# Altium footprint library NDLib.PCBLIB: 499 footprints (part 8 of 32)
Each footprint in its own frame and in the unit in brackets; x right, y up, seen from the top. Pads: shape width x height; smd on the part's side, far side on the other; paste and mask are expansions set on the pad; w line width, h text height; cw(c..) or ccw(c..) is an arc to the next point about the centre after c.
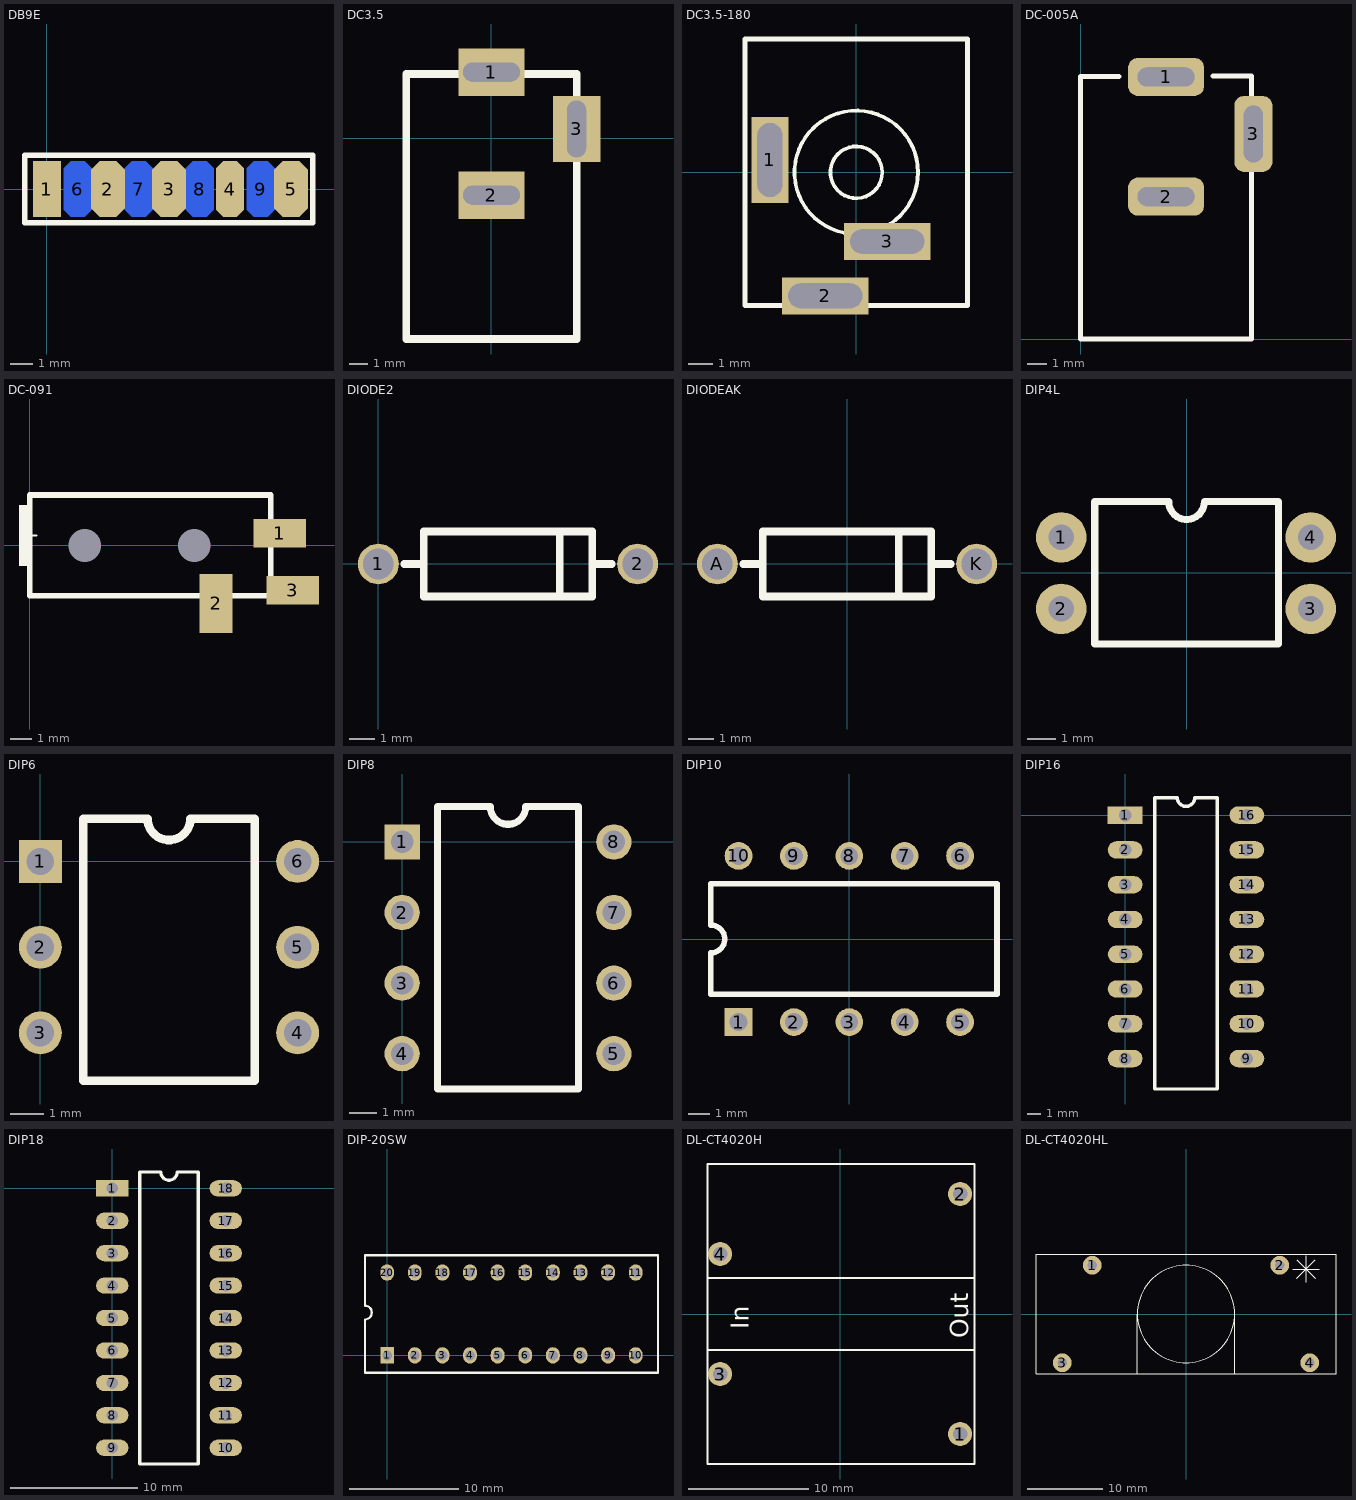
[diagram p7: the footprints below, top view; thin cyan lines are the x and y axes]

## DB9E [mil]
pads (9):
  rect 50x100 smd: 1(0,0)
  oct 60x100 smd: 2(109,0) 3(218,0) 5(436,0)
  oct 50x100 smd: 4(327,0)
  oct 50x100 smd far side: 6(55,0) 7(164,0) 8(273,0) 9(382,0)
TopOverlay:
  lines w10: -40,-60 475,-60 475,60 -40,60 -40,-60

## DC3.5 [mm]
height 15
pads (3):
  rect 3.5x2.5 hole 1 slot 3 at 0 deg: 1(0,3.5) 2(0,-3)
  rect 2.5x3.5 hole 1 slot 3 at 90 deg: 3(4.5,0.5)
TopOverlay:
  lines w0.4: -4.5,-10.6 -4.5,3.4 4.5,3.4 4.5,-10.6 -4.5,-10.6

## DC3.5-180 [mm]
height 15
pads (3):
  rect 1.5x3.5 hole 1 slot 3 at 90 deg: 1(-3.5,0.5)
  rect 3.5x1.5 hole 1 slot 3 at 0 deg: 2(-1.25,-5) 3(1.25,-2.8)
TopOverlay:
  circle w0.152: c0,0 r1.05
  circle w0.152: c0,0 r2.5
  lines w0.2: -4.5,-5.4 -4.5,5.4 4.5,5.4 4.5,-5.4 -4.5,-5.4

## DC-005A [mm]
height 7
pads (3):
  rrect50% 4x2 hole 1 slot 3 at 0 deg: 1(4.5,13.8) 2(4.5,7.5)
  rrect50% 2x4 hole 1 slot 3 at 90 deg: 3(9.1,10.8)
TopOverlay:
  lines w0.254: 2.018,13.818 0,13.818 0,0 9,0 9,8.8 ; 6.957,13.843 9,13.843 9,12.8
3D body: height 11.02, standoff -3.48, extent -0.003,0.017 9.503,13.843

## DC-091 [mm]
pads (5):
  round 0 hole 1.5 mask+0: 0(2.5,0) 0(7.5,0)
  rect 2.4x1.3 smd: 1(11.4,0.55) 3(12,-2.05)
  rect 1.5x2.7 smd: 2(8.5,-2.65)
TopOverlay:
  rectangle: -0.5,-0.95 0.1,1.85
  lines w0.1: -0.2,0.45 0.3,0.45
  lines w0.254: 0,-2.3 0,2.3 11,2.3 11,-2.3 0,-2.3
3D body: height 4.4, standoff -0.8, extent 0.025,-3.875 12.625,2.425

## DIODE2 [mm]
pads (2):
  round 1.6 / inner round 1.6 / far side round 2 hole 1.2: 1(0,0) 2(10.16,0)
TopOverlay:
  lines w0.305: 1.016,0 1.778,0 ; 7.112,-1.27 7.112,1.27 ; 8.382,0 9.144,0 ; 1.778,-1.27 1.778,1.27 8.382,1.27 8.382,-1.27 1.778,-1.27
3D body: height 3.3, standoff -2, extent -0.53,-1.3 10.53,1.3

## DIODEAK [mm]
height 2.5
pads (2):
  round 1.6 / inner round 1.6 / far side round 2 hole 1.2: A(-5.08,0) K(5.08,0)
TopOverlay:
  lines w0.305: -4.064,0 -3.302,0 ; 2.032,-1.27 2.032,1.27 ; 3.302,0 4.064,0 ; -3.302,-1.27 3.302,-1.27 3.302,1.27 -3.302,1.27 -3.302,-1.27
3D body: height 3.3, standoff -2, extent -5.53,-1.3 5.53,1.3

## DIP4L [mm]
height 5
pads (4):
  round 1.8 hole 0.914: 1(-4.469,1.266) 2(-4.469,-1.284) 3(4.431,-1.284) 4(4.431,1.266)
TopOverlay:
  lines w0.254: -3.275,-2.54 -3.275,2.54 -0.635,2.54 ccw(c0,2.54) 0.635,2.54 3.275,2.54 3.275,-2.54 -3.275,-2.54

## DIP6 [mil]
pads (6):
  rect 50x50 hole 32: 1(0,0)
  round 50 hole 32: 2(0,-100) 3(0,-200) 4(300,-200) 5(300,-100) 6(300,0)
TopOverlay:
  lines w10: 50,-255.91 250,-255.91 250,50 175,50 cw(c150,50) 125,50 50,50 50,-255.91
3D body: height 200, standoff -137.8, extent -50154.92,-50214.96 -49845.08,-49785.04

## DIP8 [mil]
pads (8):
  rect 50x50 hole 32: 1(0,0)
  round 50 hole 32: 2(0,-100) 3(0,-200) 4(0,-300) 5(300,-300) 6(300,-200) 7(300,-100) 8(300,0)
TopOverlay:
  lines w10: 50,-350 50,50 125,50 ccw(c150,50) 175,50 250,50 250,-350 50,-350
3D body: height 188.19, standoff -109.84, extent -4.84,-363.92 305,66

## DIP10 [mil]
pads (10):
  rect 50x50 hole 32: 1(-200,-150)
  round 50 hole 32: 2(-100,-150) 3(0,-150) 4(100,-150) 5(200,-150) 6(200,150) 7(100,150) 8(0,150) 9(-100,150) 10(-200,150)
TopOverlay:
  lines w10: -250,-100 266.73,-100 266.73,100 -250,100 -250,25 cw(c-250,0) -250,-25 -250,-100

## DIP16 [mil]
pads (16):
  rect 100x50 hole 36: 1(0,0)
  oval 100x50 hole 36: 2(0,-100) 3(0,-200) 4(0,-300) 5(0,-400) 6(0,-500) 7(0,-600) 8(0,-700) 9(350,-700) 10(350,-600) 11(350,-500) 12(350,-400) 13(350,-300) 14(350,-200) 15(350,-100) 16(350,0)
TopOverlay:
  lines w10: 85,-787.4 265,-787.4 265,50 200,50 cw(c175,50) 150,50 85,50 85,-787.4

## DIP18 [mil]
pads (18):
  rect 100x50 hole 36: 1(0,0)
  oval 100x50 hole 36: 2(0,-100) 3(0,-200) 4(0,-300) 5(0,-400) 6(0,-500) 7(0,-600) 8(0,-700) 9(0,-800) 10(350,-800) 11(350,-700) 12(350,-600) 13(350,-500) 14(350,-400) 15(350,-300) 16(350,-200) 17(350,-100) 18(350,0)
TopOverlay:
  lines w10: 85,-850 85,50 150,50 ccw(c175,50) 200,50 265,50 265,-850 85,-850

## DIP-20SW [mm] "DIP; 16 Leads; Row Spacing 7.62 mm; Pitch 2.54 mm"
pads (20):
  rect 1.27x1.5 hole 0.9: 1(0,0)
  oval 1.27x1.5 hole 0.9: 2(2.54,0) 3(5.08,0) 4(7.62,0) 5(10.16,0) 6(12.7,0) 7(15.24,0) 8(17.78,0) 9(20.32,0) 10(22.86,0) 11(22.86,7.62) 12(20.32,7.62) 13(17.78,7.62) 14(15.24,7.62) 15(12.7,7.62) 16(10.16,7.62) 17(7.62,7.62) 18(5.08,7.62) 19(2.54,7.62) 20(0,7.62)
TopOverlay:
  lines w0.2: -2.05,-1.59 -2.05,3.3 ccw(c-2.05,3.935) -2.05,4.57 ; -2.05,4.6 -2.05,9.2 ; 24.91,-1.59 24.91,9.2
  lines w0.203: -2.05,-1.59 24.892,-1.59 ; -2.05,9.2 24.892,9.2
3D body: height 8.71, standoff -3.99, extent -2.086,-2.639 24.794,8.661

## DL-CT4020H [mm]
height 25
pads (4):
  round 2 hole 1.2: 1(10,-10) 2(10,10) 3(-10,-5) 4(-10,5)
TopOverlay:
  lines w0.152: -11.05,-3 11.2,-3 ; -11.05,3 11.2,3 ; -11.05,-12.5 11.2,-12.5 11.2,12.5 -11.05,12.5 -11.05,-12.5
  text "In" at -7.62,-1.27 h1.52
  text "Out" at 10.668,-2.032 h1.52

## DL-CT4020HL [mm]
height 40
pads (4):
  round 2.5 hole 1.3: 1(-12.5,6.5) 2(12.5,6.5) 3(-16.5,-6.5) 4(16.5,-6.5)
TopOverlay:
  circle w0.152: c0,0 r6.5
  lines w0.127: -6.5,-8 -6.5,0 ; 6.5,-8 6.5,0 ; 14.25,6 17.75,6 ; 14.763,4.763 17.237,7.237 ; 14.763,7.237 17.237,4.763 ; 16,4.25 16,7.75
  lines w0.152: -20,-8 20,-8 20,8 -20,8 -20,-8